# Altium footprint library pcb.PcbLib: 397 footprints (part 21 of 25)
Each footprint in its own frame and in the unit in brackets; x right, y up, seen from the top. Pads: shape width x height; smd on the part's side, far side on the other; paste and mask are expansions set on the pad; w line width, h text height; cw(c..) or ccw(c..) is an arc to the next point about the centre after c.
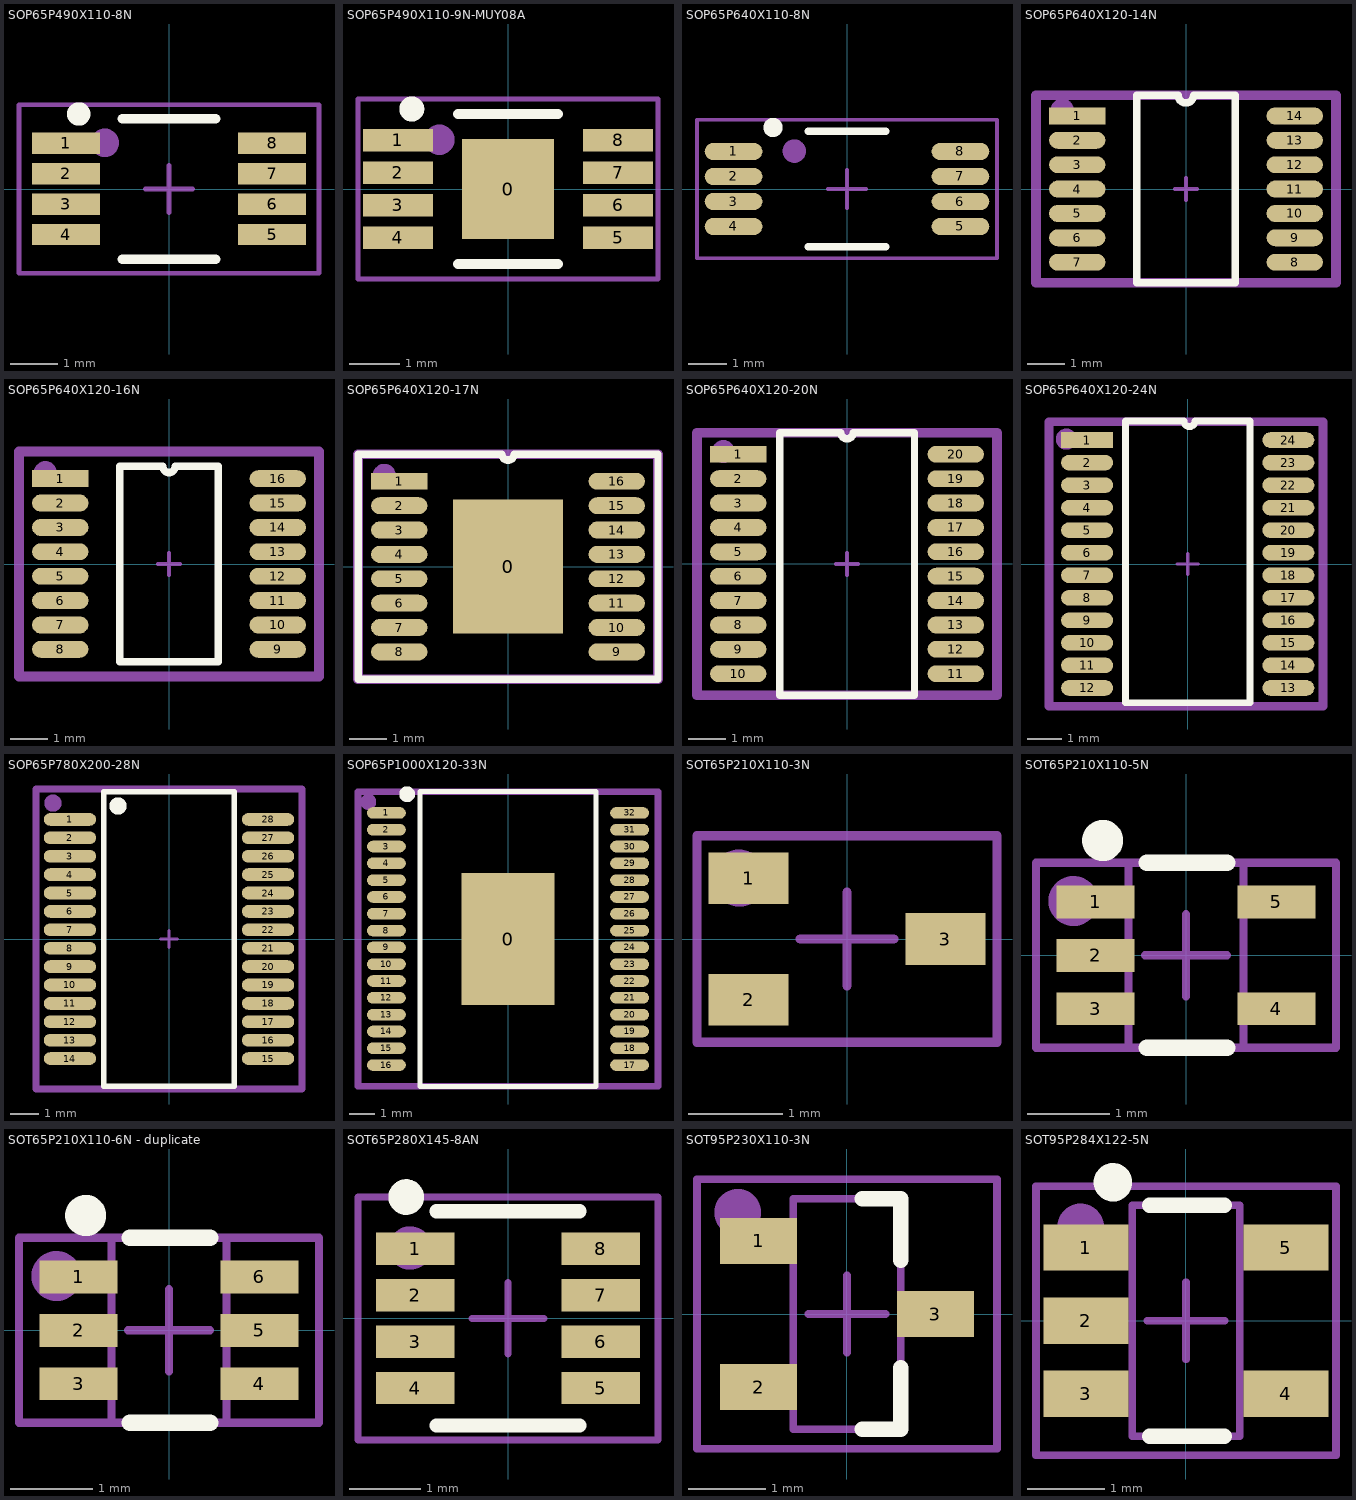
[diagram p20: the footprints below, top view; thin cyan lines are the x and y axes]

## SOP65P490X110-8N [mm] "SOP,0.65mm,pitch;8 pin,3.00mm W X 3.00mm L X 1.10mm H body"
height 1.1
pads (8):
  rect 1.45x0.45 smd: 1(-2.2,0.975) 2(-2.2,0.325) 3(-2.2,-0.325) 4(-2.2,-0.975) 5(2.2,-0.975) 6(2.2,-0.325) 7(2.2,0.325) 8(2.2,0.975)
Top Overlay:
  circle w0.25: c-1.925,1.6 r0.125
  lines w0.2: -1,-1.5 1,-1.5 ; -1,1.5 1,1.5
Mechanical 15:
  circle w0.406: c-1.37,0.985 r0.1
  lines w0.1: -0.5,0 0.5,0 ; 0,-0.5 0,0.5 ; -3.2,-1.8 3.2,-1.8 3.2,1.8 -3.2,1.8 -3.2,-1.8
  text ".Designator" at -2.5,-1.2 h0.51
3D body: height 1.3, standoff 0, extent -1.5,-1.5 1.5,1.5

## SOP65P490X110-9N-MUY08A [mm]
height 1.1
pads (9):
  rect 1.85x2 smd: 0(0,0)
  rect 1.4x0.45 smd: 1(-2.2,0.975) 2(-2.2,0.325) 3(-2.2,-0.325) 4(-2.2,-0.975) 5(2.2,-0.975) 6(2.2,-0.325) 7(2.2,0.325) 8(2.2,0.975)
Top Overlay:
  circle w0.25: c-1.925,1.6 r0.125
  lines w0.2: -1,-1.5 1,-1.5 ; -1,1.5 1,1.5
Mechanical 15:
  circle w0.406: c-1.37,0.985 r0.1
  lines w0.1: -0.5,0 0.5,0 ; 0,-0.5 0,0.5 ; -3,-1.8 3,-1.8 3,1.8 -3,1.8 -3,-1.8
  text ".Designator" at -2.5,-1.2 h0.51
3D body: height 1.3, standoff 0, extent -1.5,-1.5 1.5,1.5

## SOP65P640X110-8N [mm] "SOP,0.65mm,pitch;8 pin,4.40mm W X 3.00mm L X 1.10mm H body"
height 1.1
pads (8):
  oval 1.5x0.45 smd: 1(-2.95,0.975) 2(-2.95,0.325) 3(-2.95,-0.325) 4(-2.95,-0.975) 5(2.95,-0.975) 6(2.95,-0.325) 7(2.95,0.325) 8(2.95,0.975)
Top Overlay:
  circle w0.25: c-1.925,1.6 r0.125
  lines w0.2: -1,-1.5 1,-1.5 ; -1,1.5 1,1.5
Mechanical 15:
  circle w0.406: c-1.37,0.985 r0.1
  lines w0.1: -0.5,0 0.5,0 ; 0,-0.5 0,0.5 ; -3.9,-1.8 -3.9,1.8 3.9,1.8 3.9,-1.8 -3.9,-1.8
  text ".Designator" at -2.5,-1.2 h0.51
3D body: height 1.3, standoff 0, extent -2.2,-1.5 2.2,1.5

## SOP65P640X120-14N [mm]
height 1
pads (14):
  rect 1.5x0.45 smd: 1(-2.9,1.95)
  oval 1.5x0.45 smd: 2(-2.9,1.3) 3(-2.9,0.65) 4(-2.9,0) 5(-2.9,-0.65) 6(-2.9,-1.3) 7(-2.9,-1.95) 8(2.9,-1.95) 9(2.9,-1.3) 10(2.9,-0.65) 11(2.9,0) 12(2.9,0.65) 13(2.9,1.3) 14(2.9,1.95)
Top Overlay:
  lines w0.2: -0.263,2.5 -1.315,2.5 -1.315,-2.5 1.315,-2.5 1.315,2.5 0.263,2.5 ; -0.207,2.5 ccw(c-0.003,2.5) 0.2,2.5
Mechanical 15:
  circle w0.406: c-3.3,2.113 r0.1
  lines w0.1: -0.3,0 0.3,0 ; 0,-0.3 0,0.3
  lines w0.254: -4,-2.5 -4,2.5 4,2.5 4,-2.5 -4,-2.5
  text ".Designator" at -1.4,-1.7 h1.02
3D body: height 1, standoff 0, extent -2.5,-2.5 2.5,2.5

## SOP65P640X120-16N [mm] "SOP,0.65mm,pitch;16 pin,4.40mm W X 5.00mm L X 1.20mm H body"
height 2.38
pads (16):
  rect 1.5x0.45 smd: 1(-2.9,2.275)
  oval 1.5x0.45 smd: 2(-2.9,1.625) 3(-2.9,0.975) 4(-2.9,0.325) 5(-2.9,-0.325) 6(-2.9,-0.975) 7(-2.9,-1.625) 8(-2.9,-2.275) 9(2.9,-2.275) 10(2.9,-1.625) 11(2.9,-0.975) 12(2.9,-0.325) 13(2.9,0.325) 14(2.9,0.975) 15(2.9,1.625) 16(2.9,2.275)
Top Overlay:
  lines w0.2: -1.315,-2.6 -1.315,2.6 -0.162,2.6 ccw(c0,2.6) 0.162,2.6 1.315,2.6 1.315,-2.6 -1.315,-2.6
Mechanical 15:
  circle w0.406: c-3.3,2.438 r0.1
  lines w0.1: -0.3,0 0.3,0 ; 0,-0.3 0,0.3
  lines w0.254: -4,-3 -4,3 4,3 4,-3 -4,-3
  text ".Designator" at -3.5,1.25 h1.02
3D body: height 1, standoff 0, extent -2.5,-2.6 2.5,2.6

## SOP65P640X120-17N [mm] "SOP,0.65mm,pitch;16 pin,4.40mm W X 5.00mm L X 1.20mm H body"
height 2.38
pads (17):
  rect 2.94x3.58 smd paste-100: 0(0,0)
  rect 1.5x0.45 smd: 1(-2.9,2.275)
  oval 1.5x0.45 smd: 2(-2.9,1.625) 3(-2.9,0.975) 4(-2.9,0.325) 5(-2.9,-0.325) 6(-2.9,-0.975) 7(-2.9,-1.625) 8(-2.9,-2.275) 9(2.9,-2.275) 10(2.9,-1.625) 11(2.9,-0.975) 12(2.9,-0.325) 13(2.9,0.325) 14(2.9,0.975) 15(2.9,1.625) 16(2.9,2.275)
Top Overlay:
  lines w0.2: -4,-3 -4,3 -0.162,3 ccw(c0,3) 0.162,3 4,3 4,-3 -4,-3
Top Paste:
  region: 1.2,-0.1 0.1,-0.1 0.1,-1.5 1.2,-1.5
  rectangle: -1.2,-1.5 -0.1,-0.1
  rectangle: -1.2,0.1 -0.1,1.5
  rectangle: 0.1,0.1 1.2,1.5
Mechanical 15:
  circle w0.406: c-3.3,2.438 r0.1
  lines w0.1: -0.3,0 0.3,0 ; 0,-0.3 0,0.3
  lines w0.254: -4,-3 -4,3 4,3 4,-3 -4,-3
  text ".Designator" at -3.5,1.25 h1.02
3D body: height 1, standoff 0, extent -2.5,-2.6 2.5,2.6

## SOP65P640X120-20N [mm]
height 1
pads (20):
  rect 1.5x0.45 smd: 1(-2.9,2.925)
  oval 1.5x0.45 smd: 2(-2.9,2.275) 3(-2.9,1.625) 4(-2.9,0.975) 5(-2.9,0.325) 6(-2.9,-0.325) 7(-2.9,-0.975) 8(-2.9,-1.625) 9(-2.9,-2.275) 10(-2.9,-2.925) 11(2.9,-2.925) 12(2.9,-2.275) 13(2.9,-1.625) 14(2.9,-0.975) 15(2.9,-0.325) 16(2.9,0.325) 17(2.9,0.975) 18(2.9,1.625) 19(2.9,2.275) 20(2.9,2.925)
Top Overlay:
  lines w0.2: -1.8,-3.5 -1.8,3.5 -0.162,3.5 ccw(c0,3.5) 0.162,3.5 1.8,3.5 1.8,-3.5 -1.8,-3.5
Mechanical 15:
  circle w0.406: c-3.3,3 r0.1
  lines w0.1: -0.3,0 0.3,0 ; 0,-0.3 0,0.3
  lines w0.254: -4,-3.5 -4,3.5 4,3.5 4,-3.5 -4,-3.5
  text ".Designator" at -3.5,-3.1 h1.02
3D body: height 1, standoff 0, extent -2.5,-3.25 2.5,3.25

## SOP65P640X120-24N [mm] "SOP,0.65mm,pitch;24 pin,4.40mm W X 7.80mm L X 1.20mm H body"
height 1.2
pads (24):
  rect 1.5x0.45 smd: 1(-2.9,3.575)
  oval 1.5x0.45 smd: 2(-2.9,2.925) 3(-2.9,2.275) 4(-2.9,1.625) 5(-2.9,0.975) 6(-2.9,0.325) 7(-2.9,-0.325) 8(-2.9,-0.975) 9(-2.9,-1.625) 10(-2.9,-2.275) 11(-2.9,-2.925) 12(-2.9,-3.575) 13(2.9,-3.575) 14(2.9,-2.925) 15(2.9,-2.275) 16(2.9,-1.625) 17(2.9,-0.975) 18(2.9,-0.325) 19(2.9,0.325) 20(2.9,0.975) 21(2.9,1.625) 22(2.9,2.275) 23(2.9,2.925) 24(2.9,3.575)
Top Overlay:
  lines w0.2: -1.8,-4 1.8,-4 1.8,4.125 0.213,4.125 cw(c0.05,4.125) -0.112,4.125 -1.8,4.125 -1.8,-4
Mechanical 15:
  circle w0.406: c-3.5,3.6 r0.1
  lines w0.1: -0.3,0 0.3,0 ; 0,-0.3 0,0.3
  lines w0.254: -4,-4.1 -4,4.1 3.9,4.1 3.9,-4.1 -4,-4.1
  text ".Designator" at -3.3,-3.5 h1.02
3D body: height 1, standoff 0, extent -2.2,-3.9 2.2,3.9

## SOP65P780X200-28N [mm]
height 2
pads (28):
  oval 1.85x0.45 smd: 1(-3.5,4.225) 2(-3.5,3.575) 3(-3.5,2.925) 4(-3.5,2.275) 5(-3.5,1.625) 6(-3.5,0.975) 7(-3.5,0.325) 8(-3.5,-0.325) 9(-3.5,-0.975) 10(-3.5,-1.625) 11(-3.5,-2.275) 12(-3.5,-2.925) 13(-3.5,-3.575) 14(-3.5,-4.225) 15(3.5,-4.225) 16(3.5,-3.575) 17(3.5,-2.925) 18(3.5,-2.275) 19(3.5,-1.625) 20(3.5,-0.975) 21(3.5,-0.325) 22(3.5,0.325) 23(3.5,0.975) 24(3.5,1.625) 25(3.5,2.275) 26(3.5,2.925) 27(3.5,3.575) 28(3.5,4.225)
Top Overlay:
  circle w0.406: c-1.8,4.7 r0.1
  lines w0.2: -2.3,-5.2 2.3,-5.2 2.3,5.2 -2.3,5.2 -2.3,-5.2
Mechanical 15:
  circle w0.406: c-4.1,4.8 r0.1
  lines w0.1: -0.3,0 0.3,0 ; 0,-0.3 0,0.3
  lines w0.254: -4.7,-5.3 4.7,-5.3 4.7,5.3 -4.7,5.3 -4.7,-5.3
  text ".Designator" at -3.9,-3.8 h1.02
3D body: height 2, standoff 0, extent -2.7,-5.3 2.7,5.3

## SOP65P1000X120-33N [mm]
height 1.1
pads (33):
  rect 3.6x5.1 smd paste-100: 0(0,0)
  oval 1.5x0.45 smd: 1(-4.7,4.875) 2(-4.7,4.225) 3(-4.7,3.575) 4(-4.7,2.925) 5(-4.7,2.275) 6(-4.7,1.625) 7(-4.7,0.975) 8(-4.7,0.325) 9(-4.7,-0.325) 10(-4.7,-0.975) 11(-4.7,-1.625) 12(-4.7,-2.275) 13(-4.7,-2.925) 14(-4.7,-3.575) 15(-4.7,-4.225) 16(-4.7,-4.875) 17(4.7,-4.875) 18(4.7,-4.225) 19(4.7,-3.575) 20(4.7,-2.925) 21(4.7,-2.275) 22(4.7,-1.625) 23(4.7,-0.975) 24(4.7,-0.325) 25(4.7,0.325) 26(4.7,0.975) 27(4.7,1.625) 28(4.7,2.275) 29(4.7,2.925) 30(4.7,3.575) 31(4.7,4.225) 32(4.7,4.875)
Top Overlay:
  circle w0.406: c-3.9,5.6 r0.1
  lines w0.2: -3.4,-5.7 -3.4,5.7 3.4,5.7 3.4,-5.7 -3.4,-5.7
Top Paste:
  rectangle: 0.2,0.2 1.5,2.3
  region: -0.2,-0.2 -1.5,-0.2 -1.5,-2.3 -0.2,-2.3
  rectangle: 0.2,-2.3 1.5,-0.2
  region: -0.2,2.3 -1.5,2.3 -1.5,0.2 -0.2,0.2
Mechanical 15:
  circle w0.406: c-5.4,5.3 r0.1
  lines w0.1: -0.3,0 0.3,0 ; 0,-0.3 0,0.3
  lines w0.254: -5.8,-5.7 -5.8,5.7 5.8,5.7 5.8,-5.7 -5.8,-5.7
  text ".Designator" at -5.1,-5.2 h1.02
3D body: height 1.1, standoff 0, extent -3.1,-5.6 3.1,5.6

## SOT65P210X110-3N [mm] "SOT323, 0.65mm,pitch;3 pin,1.25mm W X 2.00mm L X 1.10mm H body"
height 1.1
pads (3):
  rect 0.85x0.55 smd: 1(-1.05,0.65) 2(-1.05,-0.65) 3(1.05,0)
Mechanical 15:
  circle w0.406: c-1.15,0.65 r0.1
  lines w0.1: -0.5,0 0.5,0 ; 0,-0.5 0,0.5 ; -1.6,-1.1 -1.6,1.1 1.6,1.1 1.6,-1.1 -1.6,-1.1
  text ".Designator" at -1.422,-0.864 h0.51
3D body: height 1.1, standoff 0, extent -0.625,-1 0.625,1

## SOT65P210X110-5N [mm] "SOT353, 0.65mm,pitch;5 pin,1.25mm W X 2.00mm L X 1.10mm H body"
height 1.1
pads (5):
  rect 0.95x0.4 smd: 1(-1.1,0.65) 2(-1.1,0) 3(-1.1,-0.65) 4(1.1,-0.65) 5(1.1,0.65)
Top Overlay:
  circle w0.25: c-1.014,1.397 r0.125
  lines w0.2: -0.475,-1.125 0.5,-1.125 ; -0.475,1.125 0.5,1.125
Mechanical 13:
  lines w0.1: -0.7,-1.125 -0.7,1.125 0.7,1.125 0.7,-1.125 -0.7,-1.125
Mechanical 15:
  circle w0.406: c-1.37,0.66 r0.1
  lines w0.1: -0.5,0 0.5,0 ; 0,-0.5 0,0.5 ; -1.825,-1.125 -1.825,1.125 1.825,1.125 1.825,-1.125 -1.825,-1.125
  text ".Designator" at -1.422,-0.864 h0.51
3D body: height 1.1, standoff 0, extent -0.7,-1.125 0.7,1.125

## SOT65P210X110-6N - duplicate [mm] "SOT363, 0.65mm,pitch;6 pin,1.25mm W X 2.00mm L X 1.10mm H body"
height 1.1
pads (6):
  rect 0.95x0.4 smd: 1(-1.1,0.65) 2(-1.1,0) 3(-1.1,-0.65) 4(1.1,-0.65) 5(1.1,0) 6(1.1,0.65)
Top Overlay:
  circle w0.25: c-1.014,1.397 r0.125
  lines w0.2: -0.475,-1.125 0.5,-1.125 ; -0.475,1.125 0.5,1.125
Mechanical 13:
  lines w0.1: -0.7,-1.125 0.7,-1.125 0.7,1.125 -0.7,1.125 -0.7,-1.125
Mechanical 15:
  circle w0.406: c-1.37,0.66 r0.1
  lines w0.1: -0.5,0 0.5,0 ; 0,-0.5 0,0.5 ; -1.825,-1.125 1.825,-1.125 1.825,1.125 -1.825,1.125 -1.825,-1.125
  text ".Designator" at -1.422,-0.864 h0.51
3D body: height 1.1, standoff 0, extent -0.7,-1.125 0.7,1.125

## SOT65P280X145-8AN [mm]
height 1.1
pads (8):
  rect 1.1x0.45 smd: 1(-1.3,0.975) 2(-1.3,0.325) 3(-1.3,-0.325) 4(-1.3,-0.975) 5(1.3,-0.975) 6(1.3,-0.325) 7(1.3,0.325) 8(1.3,0.975)
Top Overlay:
  circle w0.25: c-1.425,1.7 r0.125
  lines w0.2: -1,-1.5 1,-1.5 ; -1,1.5 1,1.5
Mechanical 15:
  circle w0.406: c-1.37,0.985 r0.1
  lines w0.1: -0.5,0 0.5,0 ; 0,-0.5 0,0.5 ; -2.1,-1.7 2.1,-1.7 2.1,1.7 -2.1,1.7 -2.1,-1.7
  text ".Designator" at -2.5,-1.2 h0.51
3D body: height 1.3, standoff 0, extent -0.8,-1.5 0.8,1.5

## SOT95P230X110-3N [mm] "SOT23, 3-Leads, Body 2.9x1.3mm, Pitch 0.95mm, Lead Span 2.5mm, IPC Medium Density"
height 1.1
pads (3):
  rect 1x0.6 smd: 1(-1.15,0.95) 2(-1.15,-0.95) 3(1.15,0)
Top Overlay:
  lines w0.2: 0.2,-1.5 0.7,-1.5 0.7,-0.7 ; 0.2,1.5 0.7,1.5 0.7,0.7
Mechanical 13:
  lines w0.1: -0.7,-1.5 -0.7,1.5 0.7,1.5 0.7,-1.5 -0.7,-1.5
Mechanical 15:
  circle w0.406: c-1.421,1.321 r0.1
  lines w0.1: -0.5,0 0.5,0 ; 0,-0.5 0,0.5 ; -1.95,-1.75 -1.95,1.75 1.95,1.75 1.95,-1.75 -1.95,-1.75
  text ".Designator" at -1.245,-1.168 h0.51
3D body: height 1.1, standoff 0, extent -0.7,-1.5 0.7,1.5

## SOT95P284X122-5N [mm] "SOT23, 5-Leads"
height 1.1
pads (5):
  rect 1.1x0.6 smd: 1(-1.3,0.95) 2(-1.3,0) 3(-1.3,-0.95) 4(1.3,-0.95) 5(1.3,0.95)
Top Overlay:
  circle w0.25: c-0.95,1.8 r0.125
  lines w0.2: -0.475,-1.5 0.5,-1.5 ; -0.475,1.5 0.5,1.5
Mechanical 13:
  lines w0.1: -0.7,-1.5 -0.7,1.5 0.7,1.5 0.7,-1.5 -0.7,-1.5
Mechanical 15:
  circle w0.406: c-1.37,1.219 r0.1
  lines w0.1: -0.5,0 0.5,0 ; 0,-0.5 0,0.5 ; -1.95,-1.75 -1.95,1.75 1.95,1.75 1.95,-1.75 -1.95,-1.75
  text ".Designator" at -1.702,-1.168 h0.51
3D body: height 1.1, standoff 0, extent -0.7,-1.5 0.7,1.5